# Altium footprint library PCB_CONNECTORS.PcbLib: 676 footprints (part 1 of 43)
Each footprint in its own frame and in the unit in brackets; x right, y up, seen from the top. Pads: shape width x height; smd on the part's side, far side on the other; paste and mask are expansions set on the pad; w line width, h text height; cw(c..) or ccw(c..) is an arc to the next point about the centre after c.
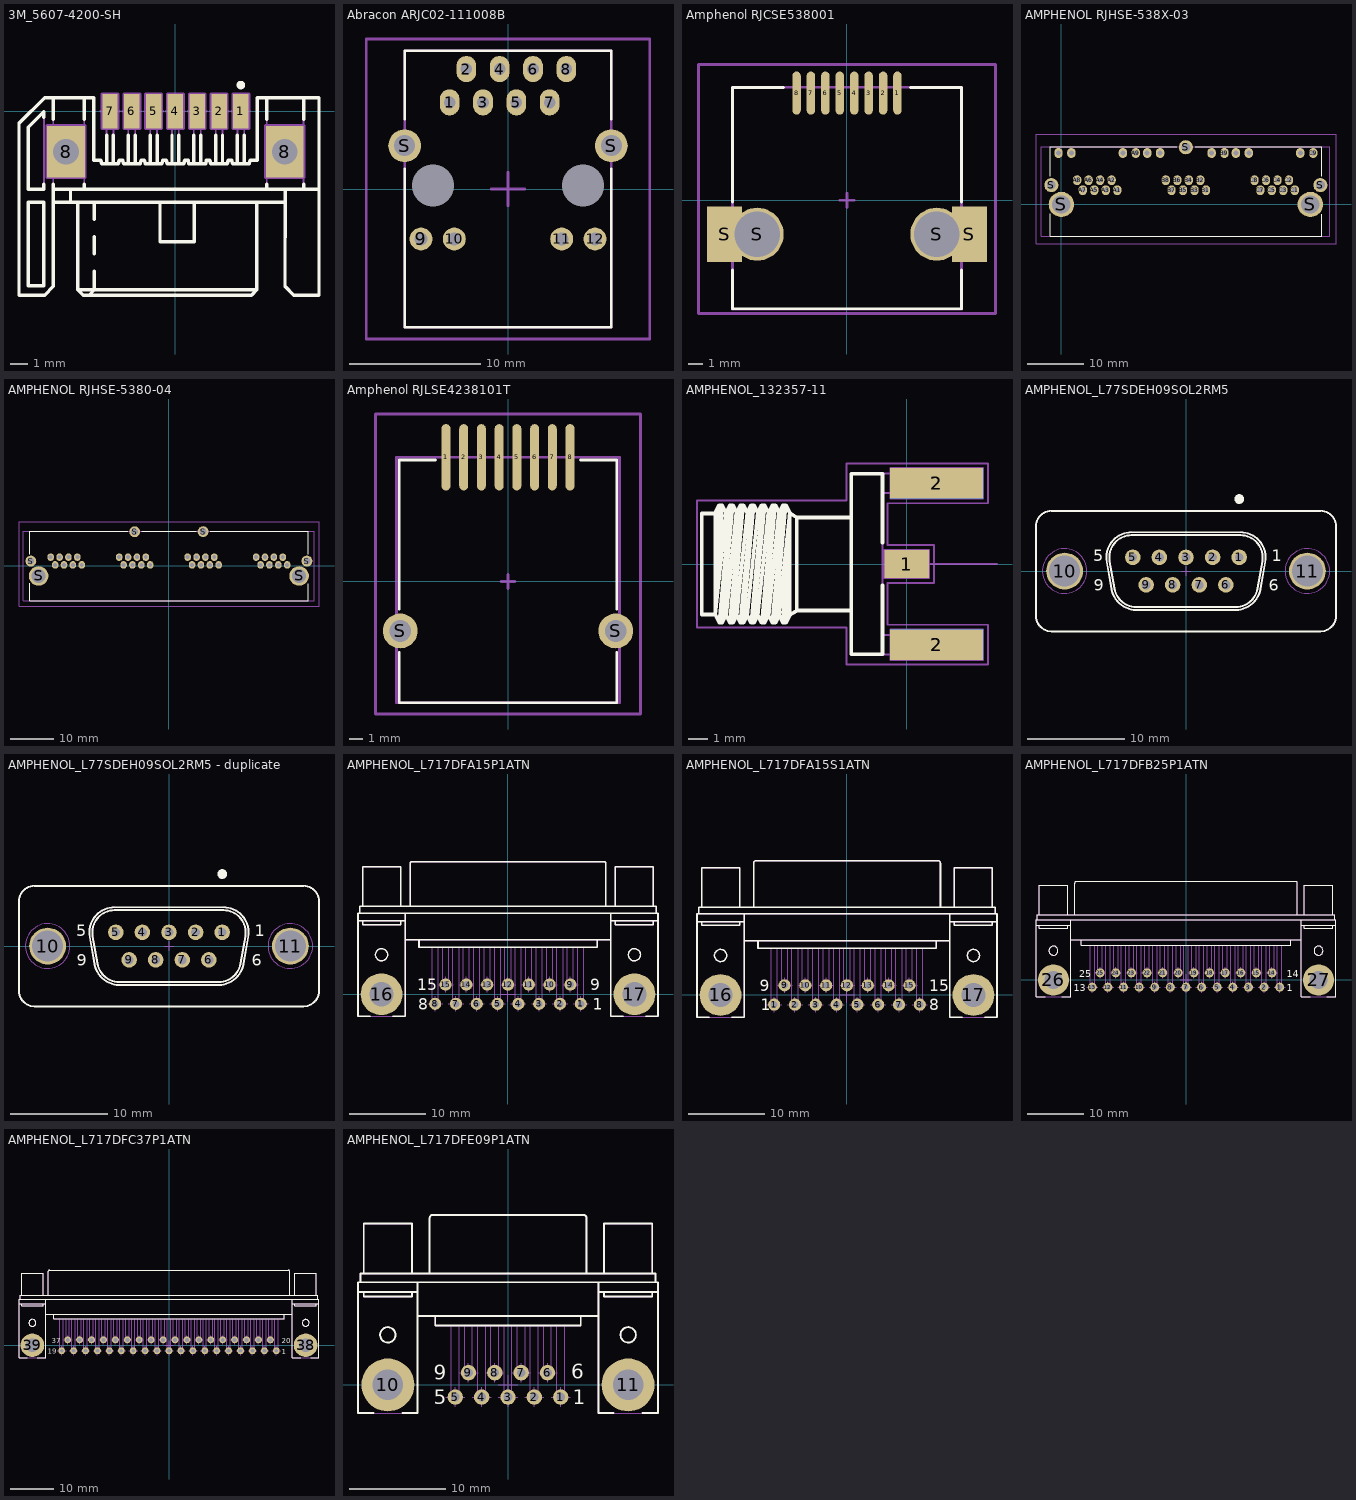
[diagram p0: the footprints below, top view; thin cyan lines are the x and y axes]

## 3M_5607-4200-SH [mm] "1.27mm (.050\") Pitch, Surface Mount, Right Angle, Serial ATA Plug (SATA)"
height 4
pads (9):
  rect 0.9x2 smd: 1(3.81,0) 2(2.54,0) 3(1.27,0) 4(0,0) 5(-1.27,0) 6(-2.54,0) 7(-3.81,0)
  rect 2.2x3 hole 1.5: 8(-6.37,-2.36) 8(6.37,-2.36)
Top Overlay:
  circle w0.25: c3.81,1.516 r0.125
  lines w0.2: -7.66,-4.25 -7.66,-4.559 -8.56,-4.559 -8.56,-0.937 -7.66,-0.037 -7.66,-0.346 ; -7.11,-5.309 6.38,-5.309 ; -7.11,-4.559 8.36,-4.559 ; -7.11,-4.26 -7.11,-10.209 -7.61,-10.709 -9.11,-10.709 -9.11,-0.709 -7.61,0.791 -4.76,0.791 -4.76,-2.859 -4.345,-2.859 -4.296,-3.059 -3.324,-3.059 -3.275,-2.859 -3.075,-2.859 -3.026,-3.059 -2.054,-3.059 -2.005,-2.859 -1.805,-2.859 -1.756,-3.059 -0.784,-3.059 -0.735,-2.859 -0.535,-2.859 -0.486,-3.059 0.486,-3.059 0.535,-2.859 0.735,-2.859 0.784,-3.059 1.756,-3.059 1.805,-2.859 2.005,-2.859 2.054,-3.059 3.026,-3.059 3.075,-2.859 3.275,-2.859 3.324,-3.059 4.296,-3.059 4.345,-2.859 4.76,-2.859 4.76,0.791 8.36,0.791 8.36,-10.709 6.88,-10.709 6.38,-10.209 6.382,-4.569 ; -7.11,-0.46 -7.11,0.791 ; -6.11,-5.309 -6.11,-4.559 ; -5.68,-5.309 -5.68,-10.409 ; -5.31,-4.559 -5.31,-4.26 ; -5.31,-0.46 -5.31,0.791 ; -5.019,-10.709 -4.719,-10.409 -4.719,-9.309 ; -4.719,-8.309 -4.719,-7.309 ; -4.719,-6.309 -4.719,-5.309 ; -4.01,-3.059 -4.01,-1.4 ; -3.61,-3.059 -3.61,-1.4 ; -2.74,-3.059 -2.74,-1.4 ; -2.34,-3.059 -2.34,-1.4 ; -1.47,-3.059 -1.47,-1.4 ; -1.07,-3.059 -1.07,-1.4 ; -0.9,-5.309 -0.9,-7.609 1.1,-7.609 1.1,-5.309 ; -0.2,-3.059 -0.2,-1.4 ; 0.2,-3.059 0.2,-1.4 ; 1.07,-3.059 1.07,-1.4 ; 1.47,-3.059 1.47,-1.4 ; 2.34,-3.059 2.34,-1.4 ; 2.74,-3.059 2.74,-1.4 ; 3.61,-3.059 3.61,-1.4 ; 4.01,-3.059 4.01,-1.4 ; 4.73,-5.309 4.73,-10.409 ; 5.31,-4.559 5.31,-4.26 ; 5.31,-0.46 5.31,0.791 ; 7.46,-4.559 7.46,-4.26 ; 7.46,-0.46 7.46,0.791 ; -5.68,-10.409 4.73,-10.409 ; -5.68,-10.409 -5.38,-10.709 4.43,-10.709 4.73,-10.409 ; -8.56,-10.159 -8.56,-5.309 -7.66,-5.309 -7.66,-10.159 -8.56,-10.159
Mechanical 8:
  circle w0.1: c6.37,-2.36 r0.75
  circle w0.1: c-6.37,-2.36 r0.75
  lines w0.2: -6.87,-2.36 -6.37,-2.36 ; -6.37,-2.86 -6.37,-2.36 ; -6.37,-1.86 -6.37,-2.36 ; -5.87,-2.36 -6.37,-2.36 ; -4.31,0 -3.81,0 ; -3.81,-0.5 -3.81,0 ; -3.81,0.5 -3.81,0 ; -3.31,0 -3.81,0 ; -3.04,0 -2.54,0 ; -2.54,-0.5 -2.54,0 ; -2.54,0.5 -2.54,0 ; -2.04,0 -2.54,0 ; -1.77,0 -1.27,0 ; -1.27,-0.5 -1.27,0 ; -1.27,0.5 -1.27,0 ; -0.77,0 -1.27,0 ; -0.5,0 0,0 ; 0,-0.5 0,0 ; 0,0.5 0,0 ; 0.5,0 0,0 ; 0.77,0 1.27,0 ; 1.27,-0.5 1.27,0 ; 1.27,0.5 1.27,0 ; 1.77,0 1.27,0 ; 2.04,0 2.54,0 ; 2.54,-0.5 2.54,0 ; 2.54,0.5 2.54,0 ; 3.04,0 2.54,0 ; 3.31,0 3.81,0 ; 3.81,-0.5 3.81,0 ; 3.81,0.5 3.81,0 ; 4.31,0 3.81,0 ; 5.87,-2.36 6.37,-2.36 ; 6.37,-2.86 6.37,-2.36 ; 6.37,-1.86 6.37,-2.36 ; 6.87,-2.36 6.37,-2.36 ; -7.47,-3.86 -5.27,-3.86 -5.27,-0.86 -7.47,-0.86 -7.47,-3.86 ; -4.26,-1 -3.36,-1 -3.36,1 -4.26,1 -4.26,-1 ; -2.99,-1 -2.09,-1 -2.09,1 -2.99,1 -2.99,-1 ; -1.72,-1 -0.82,-1 -0.82,1 -1.72,1 -1.72,-1 ; -0.45,-1 0.45,-1 0.45,1 -0.45,1 -0.45,-1 ; 0.82,-1 1.72,-1 1.72,1 0.82,1 0.82,-1 ; 2.09,-1 2.99,-1 2.99,1 2.09,1 2.09,-1 ; 3.36,-1 4.26,-1 4.26,1 3.36,1 3.36,-1 ; 5.27,-3.86 7.47,-3.86 7.47,-0.86 5.27,-0.86 5.27,-3.86
Mechanical 14:
  lines w0.1: -7.11,-5.309 6.38,-5.309 ; -7.11,-4.559 8.36,-4.559 ; -7.11,0.791 -7.11,-10.209 -7.61,-10.709 -9.11,-10.709 -9.11,-0.709 -7.61,0.791 -4.76,0.791 -4.76,-2.859 -4.345,-2.859 -4.296,-3.059 -3.324,-3.059 -3.275,-2.859 -3.075,-2.859 -3.026,-3.059 -2.054,-3.059 -2.005,-2.859 -1.805,-2.859 -1.756,-3.059 -0.784,-3.059 -0.735,-2.859 -0.535,-2.859 -0.486,-3.059 0.486,-3.059 0.535,-2.859 0.735,-2.859 0.784,-3.059 1.756,-3.059 1.805,-2.859 2.005,-2.859 2.054,-3.059 3.026,-3.059 3.075,-2.859 3.275,-2.859 3.324,-3.059 4.296,-3.059 4.345,-2.859 4.76,-2.859 4.76,0.791 8.36,0.791 8.36,-10.709 6.88,-10.709 6.38,-10.209 6.382,-4.569 ; -6.11,-5.309 -6.11,-4.559 ; -5.68,-5.309 -5.68,-10.409 ; -5.31,-4.559 -5.31,0.791 ; -5.019,-10.709 -4.719,-10.409 -4.719,-9.309 ; -4.719,-8.309 -4.719,-7.309 ; -4.719,-6.309 -4.719,-5.309 ; -4.01,-3.059 -4.01,0.591 -3.61,0.591 -3.61,-3.059 ; -2.74,-3.059 -2.74,0.591 -2.34,0.591 -2.34,-3.059 ; -1.47,-3.059 -1.47,0.591 -1.07,0.591 -1.07,-3.059 ; -0.9,-5.309 -0.9,-7.609 1.1,-7.609 1.1,-5.309 ; -0.2,-3.059 -0.2,0.591 0.2,0.591 0.2,-3.059 ; 1.07,-3.059 1.07,0.591 1.47,0.591 1.47,-3.059 ; 2.34,-3.059 2.34,0.591 2.74,0.591 2.74,-3.059 ; 3.61,-3.059 3.61,0.591 4.01,0.591 4.01,-3.059 ; 4.73,-5.309 4.73,-10.409 ; 5.31,-4.559 5.31,0.791 ; 7.46,-4.559 7.46,0.791 ; -5.68,-10.409 4.73,-10.409 ; -5.68,-10.409 -5.38,-10.709 4.43,-10.709 4.73,-10.409 ; -8.56,-10.159 -8.56,-5.309 -7.66,-5.309 -7.66,-10.159 -8.56,-10.159 ; -8.56,-4.559 -8.56,-0.937 -7.66,-0.037 -7.66,-4.559 -8.56,-4.559 ; -6.52,-3.535 -6.52,-1.177 -6.22,-1.177 -6.22,-3.535 -6.52,-3.535 ; 6.22,-3.535 6.22,-1.177 6.52,-1.177 6.52,-3.535 6.22,-3.535
3D body "3M_5607-4200-SH.stp": height 4, standoff -2.7, extent -9.11,-10.709 8.36,0.791

## Abracon ARJC02-111008B [mm]
height 13.55
pads (16):
  oval 1.5x2 hole 0.9: 1(-4.445,6.6) 2(-3.175,9.14) 3(-1.905,6.6) 4(-0.635,9.14) 5(0.635,6.6) 6(1.905,9.14) 7(3.175,6.6) 8(4.445,9.14)
  round 1.75 hole 1.02: 9(-6.63,-3.81) 10(-4.09,-3.81) 11(4.09,-3.81) 12(6.63,-3.81)
  round 0 hole 3.2 unplated: M(-5.715,0.25) M(5.715,0.25)
  round 2.5 hole 1.6: S(-7.875,3.3) S(7.875,3.3)
Top Overlay:
  lines w0.2: -7.874,1.52 -7.874,-10.545 0,-10.545 7.874,-10.545 7.874,1.52 ; -7.874,5.33 -7.874,10.537 0,10.537 7.874,10.537 7.874,5.33
Mechanical 1:
  lines w0.2: -7.874,-10.545 -7.874,10.537 7.874,10.537 7.874,-10.545 -7.874,-10.545
Mechanical 15:
  lines w0.2: -1.27,0 1.27,0 ; 0,-1.27 0,1.27 ; -10.795,-11.43 -10.795,11.43 10.795,11.43 10.795,-11.43 -10.795,-11.43
3D body "Abracon ARJC02-111008B.STEP": height 16.07, standoff -3.7, extent -10.336,-10.555 10.336,10.546

## Amphenol RJCSE538001 [mm]
height 13.46
pads (12):
  oval 0.6x3.05 smd: 1(3.57,7.58) 2(2.55,7.58) 3(1.53,7.58) 4(0.51,7.58) 5(-0.51,7.58) 6(-1.53,7.58) 7(-2.55,7.58) 8(-3.57,7.58)
  rect 2.5x3.9 smd: S(-8.66,-2.4) S(8.66,-2.4)
  round 3.75 hole 3.25: S(-6.35,-2.4) S(6.35,-2.4)
Top Overlay:
  lines w0.2: -8.1,-4.92 -8.1,-7.67 0,-7.67 8.1,-7.67 8.1,-4.92 ; -8.1,-0.12 -8.1,7.98 -4.5,7.98 ; 4.5,7.98 8.1,7.98 8.1,-0.12
Mechanical 13:
  lines w0.2: -8.1,-7.7 8.1,-7.7 8.1,8 -8.1,8 -8.1,-7.7
Mechanical 15:
  lines w0.2: -0.5,0 0.5,0 ; 0,-0.5 0,0.5 ; -10.5,-8 -10.5,9.6 10.5,9.6 10.5,-8 -10.5,-8
3D body "Amphenol RJCSE538001.STEP": height 14.77, standoff -1.27, extent -9.43,-7.66 9.43,8.875

## AMPHENOL RJHSE-538X-03 [mm]
height 13.46
pads (41):
  oval 1.5x1.75 hole 0.9: A1(9.93,2.54) A2(8.91,4.32) A3(7.89,2.54) A4(6.87,4.32) A5(5.85,2.54) A6(4.83,4.32) A7(3.81,2.54) A8(2.79,4.32) A9(13.21,9.14) A10(10.92,9.14) A11(1.78,9.14) A12(-0.51,9.14) B1(25.68,2.54) B2(24.66,4.32) B3(23.64,2.54) B4(22.62,4.32) B5(21.6,2.54) B6(20.58,4.32) B7(19.56,2.54) B8(18.54,4.32) B9(28.96,9.14) B10(26.67,9.14) B11(17.53,9.14) B12(15.24,9.14) C1(41.43,2.54) C2(40.41,4.32) C3(39.39,2.54) C4(38.37,4.32) C5(37.35,2.54) C6(36.33,4.32) C7(35.31,2.54) C8(34.29,4.32) C9(44.71,9.14) C10(42.42,9.14) C11(33.28,9.14) C12(30.99,9.14)
  round 2.5 hole 1.57: S(-1.78,3.43) S(22.1,10.16) S(45.98,3.43)
  round 4.5 hole 3.25: S(0,0) S(44.2,0)
Top Overlay:
  lines w0.2: -2,-1.675 -2,-5.65 46.25,-5.65 ; -2,5 -2,10.25 20.5,10.25 ; 23.75,10.25 46.25,10.25 ; 46.26,-5.65 46.26,-1.75 ; 46.26,5 46.26,10.25 ; 20.5,10.25 20.5,10.25
Mechanical 1:
  lines w0.2: 47.67,10.25 -3.525,10.25 -3.525,-5.65 47.686,-5.65 47.686,10.235
Mechanical 15:
  lines w0.2: -4.5,-7 -4.5,12.5 48.76,12.5 48.76,-7 -4.5,-7
3D body "Amphenol RJHSE-538X-03-REVT1.STEP": height 14.47, standoff -4.44, extent -3.345,-6.108 47.825,10.481

## AMPHENOL RJHSE-5380-04 [mm]
height 13.46
pads (38):
  oval 1.5x1.75 hole 0.9: A1(-20.04,0.24) A2(-21.06,2.02) A3(-22.08,0.24) A4(-23.1,2.02) A5(-24.12,0.24) A6(-25.14,2.02) A7(-26.16,0.24) A8(-27.18,2.02) B1(-4.29,0.24) B2(-5.31,2.02) B3(-6.33,0.24) B4(-7.35,2.02) B5(-8.37,0.24) B6(-9.39,2.02) B7(-10.41,0.24) B8(-11.43,2.02) C1(11.46,0.24) C2(10.44,2.02) C3(9.42,0.24) C4(8.4,2.02) C5(7.38,0.24) C6(6.36,2.02) C7(5.34,0.24) C8(4.32,2.02) D1(27.21,0.24) D2(26.19,2.02) D3(25.17,0.24) D4(24.15,2.02) D5(23.13,0.24) D6(22.11,2.02) D7(21.09,0.24) D8(20.07,2.02)
  round 2.5 hole 1.57: S(-31.75,1.13) S(-7.87,7.86) S(7.88,7.89) S(31.75,1.13)
  round 4.5 hole 3.25: S(-29.97,-2.3) S(29.97,-2.3)
Top Overlay:
  lines w0.2: -31.97,-3.975 -31.97,-7.95 32.03,-7.95 32.03,-4.05 ; -31.97,2.7 -31.97,7.95 -9.47,7.95 ; -6.22,7.95 6.28,7.95 ; 9.53,7.95 32.03,7.95 ; 32.03,2.7 32.03,7.95 ; -9.47,7.95 -9.47,7.95 ; 32.03,7.95 32.03,7.95
Mechanical 1:
  lines w0.2: -33.495,-7.95 33.456,-7.95 33.456,7.95 -33.495,7.95 -33.495,-7.95
Mechanical 15:
  lines w0.2: -34.47,-9.3 34.53,-9.3 34.53,10.2 -34.47,10.2 -34.47,-9.3
3D body "Amphenol RJHSE-5380-04-REVT1.STEP": height 14.68, standoff -4.17, extent -33.47,-8 33.481,7.9

## Amphenol RJLSE4238101T [mm] "Surface mount modular jack with shield"
height 11.93
pads (10):
  oval 0.64x4.75 smd: 1(-4.445,8.9) 2(-3.175,8.9) 3(-1.905,8.9) 4(-0.635,8.9) 5(0.635,8.9) 6(1.905,8.9) 7(3.175,8.9) 8(4.445,8.9)
  round 2.5 hole 1.57: S(-7.72,-3.545) S(7.72,-3.545)
Top Overlay:
  lines w0.2: -7.8,-5.1 -7.8,-8.7 0.6,-8.7 7.8,-8.7 7.8,-5.1 ; -7.8,-2 -7.8,8.7 -5.2,8.7 ; 5.2,8.7 7.8,8.7 7.8,-2
Mechanical 13:
  lines w0.2: -8,-8.7 -8,8.9 8,8.9 8,-8.7 -8,-8.7
Mechanical 15:
  lines w0.2: -0.5,0 0.5,0 ; 0,-0.5 0,0.5 ; -9.5,-9.5 -9.5,12 9.5,12 9.5,-9.5 0,-9.5 -9.5,-9.5
3D body "Amphenol RJLSE4238101T.STEP": height 11.76, standoff -2.19, extent -8.051,-8.701 8.049,9.863

## AMPHENOL_132357-11 [mm] "SMA End Launch Jack for 1.58mm PCB, 50 Ohm, Flat Tab Contact"
height 7.92
pads (5):
  rect 2.35x1.5 smd: 1(0,0)
  rect 4.9x1.6 smd: 2(1.575,-4.25) 2(1.575,4.25)
  rect 4.9x1.6 smd far side: 2(1.575,-4.25) 2(1.575,4.25)
Top Overlay:
  lines w0.2: -10.09,2.665 -10.805,2.665 -10.805,-2.665 -10.09,-2.665 ; -6.17,-2.665 -5.795,-2.453 ; -2.925,-2.453 -5.795,-2.453 ; -2.925,2.447 -5.795,2.447 ; -1.275,-1.137 -1.275,-4.76 -2.925,-4.76 -2.925,4.76 -1.275,4.76 -1.275,1.137 ; -10.09,-2.665 -9.879,3.094 ; -10.09,-2.665 -9.741,3.094 ; -10.09,-2.665 -9.53,2.715 ; -10.09,-2.665 -9.879,-3.094 ; -10.09,-2.665 -10.09,2.715 -9.879,3.094 ; -9.879,-3.094 -9.319,3.094 ; -9.879,-3.094 -9.741,-3.094 ; -9.879,3.094 -9.741,3.094 ; -9.741,-3.094 -9.181,3.094 ; -9.741,-3.094 -9.53,-2.715 ; -9.741,3.094 -9.53,2.715 ; -9.53,-2.715 -8.97,2.715 ; -9.53,-2.715 -9.319,-3.094 ; -9.53,2.715 -9.319,3.094 ; -9.319,-3.094 -8.759,3.094 ; -9.319,-3.094 -9.181,-3.094 ; -9.319,3.094 -9.181,3.094 ; -9.181,-3.094 -8.621,3.094 ; -9.181,-3.094 -8.97,-2.715 ; -9.181,3.094 -8.97,2.715 ; -8.97,-2.715 -8.41,2.715 ; -8.97,-2.715 -8.759,-3.094 ; -8.97,2.715 -8.759,3.094 ; -8.759,-3.094 -8.199,3.094 ; -8.759,-3.094 -8.621,-3.094 ; -8.759,3.094 -8.621,3.094 ; -8.621,-3.094 -8.061,3.094 ; -8.621,-3.094 -8.41,-2.715 ; -8.621,3.094 -8.41,2.715 ; -8.41,-2.715 -7.85,2.715 ; -8.41,-2.715 -8.199,-3.094 ; -8.41,2.715 -8.199,3.094 ; -8.199,-3.094 -7.639,3.094 ; -8.199,-3.094 -8.061,-3.094 ; -8.199,3.094 -8.061,3.094 ; -8.061,-3.094 -7.501,3.094 ; -8.061,-3.094 -7.85,-2.715 ; -8.061,3.094 -7.85,2.715 ; -7.85,-2.715 -7.29,2.715 ; -7.85,-2.715 -7.639,-3.094 ; -7.85,2.715 -7.639,3.094 ; -7.639,-3.094 -7.079,3.094 ; -7.639,-3.094 -7.501,-3.094 ; -7.639,3.094 -7.501,3.094 ; -7.501,-3.094 -6.941,3.094 ; -7.501,-3.094 -7.29,-2.715 ; -7.501,3.094 -7.29,2.715 ; -7.29,-2.715 -6.73,2.715 ; -7.29,-2.715 -7.079,-3.094 ; -7.29,2.715 -7.079,3.094 ; -7.079,-3.094 -6.519,3.094 ; -7.079,-3.094 -6.941,-3.094 ; -7.079,3.094 -6.941,3.094 ; -6.941,-3.094 -6.381,3.094 ; -6.941,-3.094 -6.73,-2.715 ; -6.941,3.094 -6.73,2.715 ; -6.73,-2.715 -6.17,2.713 ; -6.73,-2.715 -6.519,-3.094 ; -6.73,2.715 -6.519,3.094 ; -6.519,-3.094 -6.17,2.713 ; -6.519,-3.094 -6.381,-3.094 ; -6.519,3.094 -6.381,3.094 ; -6.381,-3.094 -6.17,2.665 -5.795,2.447 ; -6.381,-3.094 -6.17,-2.715 -6.17,2.713 ; -6.381,3.094 -6.17,2.713 ; -5.795,-2.453 -5.795,2.447
Mechanical 8:
  lines w0.1: -0.5,0 0,0 ; 0,-0.5 0,0 ; 0,0.5 0,0 ; 0.5,0 0,0 ; 1.075,-4.25 1.575,-4.25 ; 1.075,4.25 1.575,4.25 ; 1.575,-4.75 1.575,-4.25 ; 1.575,-3.75 1.575,-4.25 ; 1.575,3.75 1.575,4.25 ; 1.575,4.75 1.575,4.25 ; 2.075,-4.25 1.575,-4.25 ; 2.075,4.25 1.575,4.25 ; -1.175,-0.75 1.175,-0.75 1.175,0.75 -1.175,0.75 -1.175,-0.75 ; -0.875,-5.05 -0.875,-3.45 4.025,-3.45 4.025,-5.05 -0.875,-5.05 ; -0.875,3.45 -0.875,5.05 4.025,5.05 4.025,3.45 -0.875,3.45
Mechanical 14:
  lines w0.1: -10.09,2.665 -10.805,2.665 -10.805,-2.665 -10.09,-2.665 ; -6.17,-2.665 -5.795,-2.453 ; -2.925,-2.453 -5.795,-2.453 ; -2.925,2.447 -5.795,2.447 ; -1.275,-4.76 -1.275,0 ; -1.275,-3.74 3.475,-3.74 3.475,-4.76 -2.925,-4.76 -2.925,4.76 3.475,4.76 3.475,3.74 -1.275,3.74 ; -1.275,-0.251 0.635,-0.251 0.635,0.251 -1.275,0.251 ; -1.275,4.76 -1.275,0 ; 4.75,0 -1.275,0 ; -10.09,-2.665 -9.879,3.094 ; -10.09,-2.665 -9.741,3.094 ; -10.09,-2.665 -9.53,2.715 ; -10.09,-2.665 -9.879,-3.094 ; -10.09,-2.665 -10.09,2.715 -9.879,3.094 ; -9.879,-3.094 -9.319,3.094 ; -9.879,-3.094 -9.741,-3.094 ; -9.879,3.094 -9.741,3.094 ; -9.741,-3.094 -9.181,3.094 ; -9.741,-3.094 -9.53,-2.715 ; -9.741,3.094 -9.53,2.715 ; -9.53,-2.715 -8.97,2.715 ; -9.53,-2.715 -9.319,-3.094 ; -9.53,2.715 -9.319,3.094 ; -9.319,-3.094 -8.759,3.094 ; -9.319,-3.094 -9.181,-3.094 ; -9.319,3.094 -9.181,3.094 ; -9.181,-3.094 -8.621,3.094 ; -9.181,-3.094 -8.97,-2.715 ; -9.181,3.094 -8.97,2.715 ; -8.97,-2.715 -8.41,2.715 ; -8.97,-2.715 -8.759,-3.094 ; -8.97,2.715 -8.759,3.094 ; -8.759,-3.094 -8.199,3.094 ; -8.759,-3.094 -8.621,-3.094 ; -8.759,3.094 -8.621,3.094 ; -8.621,-3.094 -8.061,3.094 ; -8.621,-3.094 -8.41,-2.715 ; -8.621,3.094 -8.41,2.715 ; -8.41,-2.715 -7.85,2.715 ; -8.41,-2.715 -8.199,-3.094 ; -8.41,2.715 -8.199,3.094 ; -8.199,-3.094 -7.639,3.094 ; -8.199,-3.094 -8.061,-3.094 ; -8.199,3.094 -8.061,3.094 ; -8.061,-3.094 -7.501,3.094 ; -8.061,-3.094 -7.85,-2.715 ; -8.061,3.094 -7.85,2.715 ; -7.85,-2.715 -7.29,2.715 ; -7.85,-2.715 -7.639,-3.094 ; -7.85,2.715 -7.639,3.094 ; -7.639,-3.094 -7.079,3.094 ; -7.639,-3.094 -7.501,-3.094 ; -7.639,3.094 -7.501,3.094 ; -7.501,-3.094 -6.941,3.094 ; -7.501,-3.094 -7.29,-2.715 ; -7.501,3.094 -7.29,2.715 ; -7.29,-2.715 -6.73,2.715 ; -7.29,-2.715 -7.079,-3.094 ; -7.29,2.715 -7.079,3.094 ; -7.079,-3.094 -6.519,3.094 ; -7.079,-3.094 -6.941,-3.094 ; -7.079,3.094 -6.941,3.094 ; -6.941,-3.094 -6.381,3.094 ; -6.941,-3.094 -6.73,-2.715 ; -6.941,3.094 -6.73,2.715 ; -6.73,-2.715 -6.17,2.713 ; -6.73,-2.715 -6.519,-3.094 ; -6.73,2.715 -6.519,3.094 ; -6.519,-3.094 -6.17,2.713 ; -6.519,-3.094 -6.381,-3.094 ; -6.519,3.094 -6.381,3.094 ; -6.381,-3.094 -6.17,2.665 -5.795,2.447 ; -6.381,-3.094 -6.17,-2.715 -6.17,2.713 ; -6.381,3.094 -6.17,2.713 ; -5.795,-2.453 -5.795,2.447
Mechanical 15:
  lines w0.1: -11.055,-3.344 -11.055,3.344 -3.175,3.344 -3.175,5.3 4.275,5.3 4.275,3.2 -1.025,3.2 -1.025,1 1.425,1 1.425,-1 -1.025,-1 -1.025,-3.2 4.275,-3.2 4.275,-5.3 -3.175,-5.3 -3.175,-3.344 -11.055,-3.344
3D body "AMPHENOL_132357-11.stp": height 4.08, standoff -3.84, extent -10.805,-4.76 3.475,4.76

## AMPHENOL_L77SDEH09SOL2RM5 [mm] "Straight D-SUB 9 Female Contacts for PCB with Rear Insert (UNC4-40) and RM5 Standoff Boardlock"
height 13
pads (11):
  round 1.6 hole 0.9: 1(5.48,1.42) 2(2.74,1.42) 3(0,1.42) 4(-2.74,1.42) 5(-5.48,1.42) 6(4.11,-1.42) 7(1.37,-1.42) 8(-1.37,-1.42) 9(-4.11,-1.42)
  round 3.8 hole 3.2: 10(-12.495,0) 11(12.495,0)
Top Overlay:
  circle w0.5: c5.48,7.42 r0.25
  lines w0.2: -15.445,-4.61 ccw(c-13.845,-4.61) -13.845,-6.21 13.845,-6.21 ccw(c13.845,-4.61) 15.445,-4.61 15.445,4.61 ccw(c13.845,4.61) 13.845,6.21 -13.845,6.21 ccw(c-13.845,4.61) -15.445,4.61 -15.445,-4.61 ; -8.161,0.949 cw(c-5.6,1.4) -5.6,4 5.6,4 cw(c5.6,1.4) 8.16,0.949 7.667,-1.851 cw(c5.106,-1.4) 5.106,-4 -5.106,-4 cw(c-5.106,-1.4) -7.667,-1.851 -8.161,0.949 ; -7.865,1.001 cw(c-5.6,1.4) -5.6,3.7 5.6,3.7 cw(c5.6,1.4) 7.865,1.001 7.371,-1.799 cw(c5.106,-1.4) 5.106,-3.7 -5.106,-3.7 cw(c-5.106,-1.4) -7.372,-1.799 -7.865,1.001
  text "1" at 8.85,1 h1.2
  text "5" at -9.525,1 h1.2
  text "6" at 8.525,-2.05 h1.2
  text "9" at -9.5,-2.025 h1.2
Mechanical 8:
  lines w0.1: -12.995,0 -12.495,0 ; -12.495,-0.5 -12.495,0 ; -12.495,0.5 -12.495,0 ; -11.995,0 -12.495,0 ; -5.98,1.42 -5.48,1.42 ; -5.48,0.92 -5.48,1.42 ; -5.48,1.92 -5.48,1.42 ; -4.98,1.42 -5.48,1.42 ; -4.61,-1.42 -4.11,-1.42 ; -4.11,-1.92 -4.11,-1.42 ; -4.11,-0.92 -4.11,-1.42 ; -3.61,-1.42 -4.11,-1.42 ; -3.24,1.42 -2.74,1.42 ; -2.74,0.92 -2.74,1.42 ; -2.74,1.92 -2.74,1.42 ; -2.24,1.42 -2.74,1.42 ; -1.87,-1.42 -1.37,-1.42 ; -1.37,-1.92 -1.37,-1.42 ; -1.37,-0.92 -1.37,-1.42 ; -0.87,-1.42 -1.37,-1.42 ; -0.5,0 0,0 ; -0.5,1.42 0,1.42 ; 0,-0.5 0,0 ; 0,0.5 0,0 ; 0,0.92 0,1.42 ; 0,1.92 0,1.42 ; 0.5,0 0,0 ; 0.5,1.42 0,1.42 ; 0.87,-1.42 1.37,-1.42 ; 1.37,-1.92 1.37,-1.42 ; 1.37,-0.92 1.37,-1.42 ; 1.87,-1.42 1.37,-1.42 ; 2.24,1.42 2.74,1.42 ; 2.74,0.92 2.74,1.42 ; 2.74,1.92 2.74,1.42 ; 3.24,1.42 2.74,1.42 ; 3.61,-1.42 4.11,-1.42 ; 4.11,-1.92 4.11,-1.42 ; 4.11,-0.92 4.11,-1.42 ; 4.61,-1.42 4.11,-1.42 ; 4.98,1.42 5.48,1.42 ; 5.48,0.92 5.48,1.42 ; 5.48,1.92 5.48,1.42 ; 5.98,1.42 5.48,1.42 ; 11.995,0 12.495,0 ; 12.495,-0.5 12.495,0 ; 12.495,0.5 12.495,0 ; 12.995,0 12.495,0
Mechanical 14:
  circle w0.1: c12.495,0 r1.5
  circle w0.1: c12.495,0 r2.3
  circle w0.1: c-12.495,0 r1.5
  circle w0.1: c-12.495,0 r2.3
  circle w0.1: c1.37,-1.42 r0.4
  circle w0.1: c4.11,-1.42 r0.4
  circle w0.1: c5.48,1.42 r0.4
  circle w0.1: c2.74,1.42 r0.4
  circle w0.1: c0,1.42 r0.4
  circle w0.1: c-1.37,-1.42 r0.4
  circle w0.1: c-4.11,-1.42 r0.4
  circle w0.1: c-2.74,1.42 r0.4
  circle w0.1: c-5.48,1.42 r0.4
  lines w0.1: -15.445,-4.61 ccw(c-13.845,-4.61) -13.845,-6.21 13.845,-6.21 ccw(c13.845,-4.61) 15.445,-4.61 15.445,4.61 ccw(c13.845,4.61) 13.845,6.21 -13.845,6.21 ccw(c-13.845,4.61) -15.445,4.61 -15.445,-4.61 ; -8.161,0.949 cw(c-5.6,1.4) -5.6,4 5.6,4 cw(c5.6,1.4) 8.16,0.949 7.667,-1.851 cw(c5.106,-1.4) 5.106,-4 -5.106,-4 cw(c-5.106,-1.4) -7.667,-1.851 -8.161,0.949 ; -7.865,1.001 cw(c-5.6,1.4) -5.6,3.7 5.6,3.7 cw(c5.6,1.4) 7.865,1.001 7.371,-1.799 cw(c5.106,-1.4) 5.106,-3.7 -5.106,-3.7 cw(c-5.106,-1.4) -7.372,-1.799 -7.865,1.001
  text "9" at -9.5,-2.025 h1.2
  text "6" at 8.525,-2.05 h1.2
  text "5" at -9.525,1 h1.2
  text "1" at 8.85,1 h1.2
3D body "AMPHENOL_L77SDEH09SOL2RM5.stp": height 13, standoff -4.2, extent -15.445,-6.21 15.445,6.21

## AMPHENOL_L77SDEH09SOL2RM5 - duplicate [mm] "Straight D-SUB 9 Female Contacts for PCB with Rear Insert (UNC4-40) and RM5 Standoff Boardlock"
height 13
pads (11):
  round 1.6 hole 0.9: 1(5.48,1.42) 2(2.74,1.42) 3(0,1.42) 4(-2.74,1.42) 5(-5.48,1.42) 6(4.11,-1.42) 7(1.37,-1.42) 8(-1.37,-1.42) 9(-4.11,-1.42)
  round 3.8 hole 3.2: 10(-12.495,0) 11(12.495,0)
Top Overlay:
  circle w0.5: c5.48,7.42 r0.25
  lines w0.2: -15.445,-4.61 ccw(c-13.845,-4.61) -13.845,-6.21 13.845,-6.21 ccw(c13.845,-4.61) 15.445,-4.61 15.445,4.61 ccw(c13.845,4.61) 13.845,6.21 -13.845,6.21 ccw(c-13.845,4.61) -15.445,4.61 -15.445,-4.61 ; -8.161,0.949 cw(c-5.6,1.4) -5.6,4 5.6,4 cw(c5.6,1.4) 8.16,0.949 7.667,-1.851 cw(c5.106,-1.4) 5.106,-4 -5.106,-4 cw(c-5.106,-1.4) -7.667,-1.851 -8.161,0.949 ; -7.865,1.001 cw(c-5.6,1.4) -5.6,3.7 5.6,3.7 cw(c5.6,1.4) 7.865,1.001 7.371,-1.799 cw(c5.106,-1.4) 5.106,-3.7 -5.106,-3.7 cw(c-5.106,-1.4) -7.372,-1.799 -7.865,1.001
  text "9" at -9.5,-2.025 h1.2
  text "6" at 8.525,-2.05 h1.2
  text "5" at -9.525,1 h1.2
  text "1" at 8.85,1 h1.2
Mechanical 8:
  lines w0.1: -12.995,0 -12.495,0 ; -12.495,-0.5 -12.495,0 ; -12.495,0.5 -12.495,0 ; -11.995,0 -12.495,0 ; -5.98,1.42 -5.48,1.42 ; -5.48,0.92 -5.48,1.42 ; -5.48,1.92 -5.48,1.42 ; -4.98,1.42 -5.48,1.42 ; -4.61,-1.42 -4.11,-1.42 ; -4.11,-1.92 -4.11,-1.42 ; -4.11,-0.92 -4.11,-1.42 ; -3.61,-1.42 -4.11,-1.42 ; -3.24,1.42 -2.74,1.42 ; -2.74,0.92 -2.74,1.42 ; -2.74,1.92 -2.74,1.42 ; -2.24,1.42 -2.74,1.42 ; -1.87,-1.42 -1.37,-1.42 ; -1.37,-1.92 -1.37,-1.42 ; -1.37,-0.92 -1.37,-1.42 ; -0.87,-1.42 -1.37,-1.42 ; -0.5,0 0,0 ; -0.5,1.42 0,1.42 ; 0,-0.5 0,0 ; 0,0.5 0,0 ; 0,0.92 0,1.42 ; 0,1.92 0,1.42 ; 0.5,0 0,0 ; 0.5,1.42 0,1.42 ; 0.87,-1.42 1.37,-1.42 ; 1.37,-1.92 1.37,-1.42 ; 1.37,-0.92 1.37,-1.42 ; 1.87,-1.42 1.37,-1.42 ; 2.24,1.42 2.74,1.42 ; 2.74,0.92 2.74,1.42 ; 2.74,1.92 2.74,1.42 ; 3.24,1.42 2.74,1.42 ; 3.61,-1.42 4.11,-1.42 ; 4.11,-1.92 4.11,-1.42 ; 4.11,-0.92 4.11,-1.42 ; 4.61,-1.42 4.11,-1.42 ; 4.98,1.42 5.48,1.42 ; 5.48,0.92 5.48,1.42 ; 5.48,1.92 5.48,1.42 ; 5.98,1.42 5.48,1.42 ; 11.995,0 12.495,0 ; 12.495,-0.5 12.495,0 ; 12.495,0.5 12.495,0 ; 12.995,0 12.495,0
Mechanical 14:
  circle w0.1: c-5.48,1.42 r0.4
  circle w0.1: c-2.74,1.42 r0.4
  circle w0.1: c-4.11,-1.42 r0.4
  circle w0.1: c-1.37,-1.42 r0.4
  circle w0.1: c0,1.42 r0.4
  circle w0.1: c2.74,1.42 r0.4
  circle w0.1: c5.48,1.42 r0.4
  circle w0.1: c4.11,-1.42 r0.4
  circle w0.1: c1.37,-1.42 r0.4
  circle w0.1: c-12.495,0 r2.3
  circle w0.1: c-12.495,0 r1.5
  circle w0.1: c12.495,0 r2.3
  circle w0.1: c12.495,0 r1.5
  lines w0.1: -15.445,-4.61 ccw(c-13.845,-4.61) -13.845,-6.21 13.845,-6.21 ccw(c13.845,-4.61) 15.445,-4.61 15.445,4.61 ccw(c13.845,4.61) 13.845,6.21 -13.845,6.21 ccw(c-13.845,4.61) -15.445,4.61 -15.445,-4.61 ; -8.161,0.949 cw(c-5.6,1.4) -5.6,4 5.6,4 cw(c5.6,1.4) 8.16,0.949 7.667,-1.851 cw(c5.106,-1.4) 5.106,-4 -5.106,-4 cw(c-5.106,-1.4) -7.667,-1.851 -8.161,0.949 ; -7.865,1.001 cw(c-5.6,1.4) -5.6,3.7 5.6,3.7 cw(c5.6,1.4) 7.865,1.001 7.371,-1.799 cw(c5.106,-1.4) 5.106,-3.7 -5.106,-3.7 cw(c-5.106,-1.4) -7.372,-1.799 -7.865,1.001